# Altium footprint library B105ic.PcbLib: 84 footprints (part 5 of 6)
Each footprint in its own frame and in the unit in brackets; x right, y up, seen from the top. Pads: shape width x height; smd on the part's side, far side on the other; paste and mask are expansions set on the pad; w line width, h text height; cw(c..) or ccw(c..) is an arc to the next point about the centre after c.
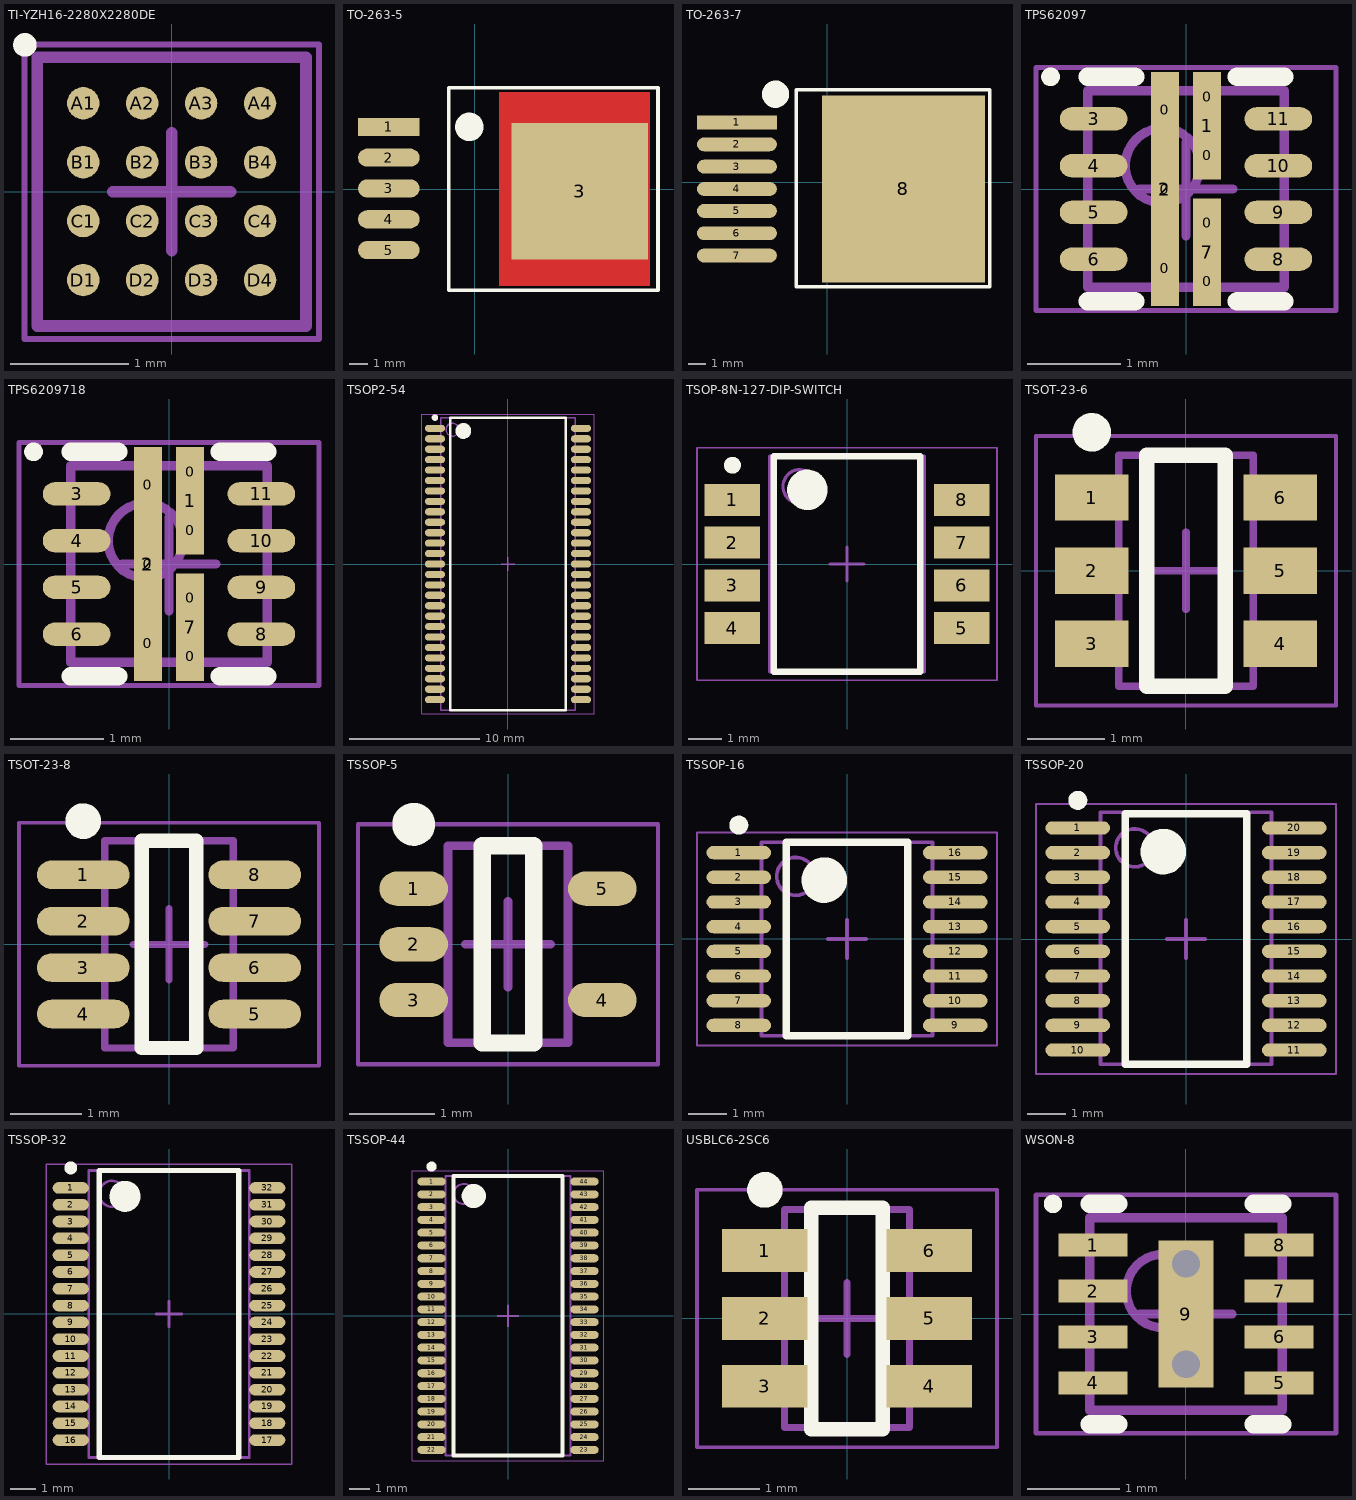
[diagram p4: the footprints below, top view; thin cyan lines are the x and y axes]

## TI-YZH16-2280X2280DE [mm] "BGA, 16-Balls, Body 2.28x2.28mm, Pitch 0.5mm"
height 0.63
pads (16):
  round 0.275 smd paste-0.138 mask+0.05: A1(-0.75,0.75) A2(-0.25,0.75) A3(0.25,0.75) A4(0.75,0.75) B1(-0.75,0.25) B2(-0.25,0.25) B3(0.25,0.25) B4(0.75,0.25) C1(-0.75,-0.25) C2(-0.25,-0.25) C3(0.25,-0.25) C4(0.75,-0.25) D1(-0.75,-0.75) D2(-0.25,-0.75) D3(0.25,-0.75) D4(0.75,-0.75)
Top Overlay:
  circle w0.1: c-1.245,1.245 r0.05
Top Paste:
  circle w0.05: c-0.162,-0.162 r0.025
  circle w0.05: c-0.338,-0.337 r0.025
  circle w0.05: c-0.338,-0.162 r0.025
  circle w0.05: c-0.162,-0.337 r0.025
  circle w0.05: c-0.162,0.162 r0.025
  circle w0.05: c-0.338,0.337 r0.025
  circle w0.05: c-0.338,0.162 r0.025
  circle w0.05: c-0.162,0.337 r0.025
  circle w0.05: c0.337,-0.337 r0.025
  circle w0.05: c0.162,-0.162 r0.025
  circle w0.05: c0.162,-0.337 r0.025
  circle w0.05: c0.337,-0.162 r0.025
  circle w0.05: c0.838,-0.337 r0.025
  circle w0.05: c0.662,-0.162 r0.025
  circle w0.05: c0.662,-0.337 r0.025
  circle w0.05: c0.838,-0.162 r0.025
  circle w0.05: c0.838,-0.838 r0.025
  circle w0.05: c0.662,-0.663 r0.025
  circle w0.05: c0.662,-0.838 r0.025
  circle w0.05: c0.838,-0.663 r0.025
  circle w0.05: c0.337,-0.838 r0.025
  circle w0.05: c0.162,-0.663 r0.025
  circle w0.05: c0.162,-0.838 r0.025
  circle w0.05: c0.337,-0.663 r0.025
  circle w0.05: c-0.162,-0.838 r0.025
  circle w0.05: c-0.338,-0.663 r0.025
  circle w0.05: c-0.338,-0.838 r0.025
  circle w0.05: c-0.162,-0.663 r0.025
  circle w0.05: c-0.663,-0.838 r0.025
  circle w0.05: c-0.838,-0.663 r0.025
  circle w0.05: c-0.838,-0.838 r0.025
  circle w0.05: c-0.663,-0.663 r0.025
  circle w0.05: c-0.663,-0.337 r0.025
  circle w0.05: c-0.838,-0.162 r0.025
  circle w0.05: c-0.838,-0.337 r0.025
  circle w0.05: c-0.663,-0.162 r0.025
  circle w0.05: c-0.663,0.162 r0.025
  circle w0.05: c-0.838,0.337 r0.025
  circle w0.05: c-0.838,0.162 r0.025
  circle w0.05: c-0.663,0.337 r0.025
  circle w0.05: c-0.663,0.663 r0.025
  circle w0.05: c-0.838,0.838 r0.025
  circle w0.05: c-0.838,0.663 r0.025
  circle w0.05: c-0.663,0.838 r0.025
  circle w0.05: c-0.162,0.663 r0.025
  circle w0.05: c-0.338,0.838 r0.025
  circle w0.05: c-0.338,0.663 r0.025
  circle w0.05: c-0.162,0.838 r0.025
  circle w0.05: c0.337,0.663 r0.025
  circle w0.05: c0.162,0.838 r0.025
  circle w0.05: c0.162,0.663 r0.025
  circle w0.05: c0.337,0.838 r0.025
  circle w0.05: c0.337,0.162 r0.025
  circle w0.05: c0.162,0.337 r0.025
  circle w0.05: c0.162,0.162 r0.025
  circle w0.05: c0.337,0.337 r0.025
  circle w0.05: c0.838,0.663 r0.025
  circle w0.05: c0.662,0.838 r0.025
  circle w0.05: c0.662,0.663 r0.025
  circle w0.05: c0.838,0.838 r0.025
  circle w0.05: c0.838,0.162 r0.025
  circle w0.05: c0.662,0.337 r0.025
  circle w0.05: c0.662,0.162 r0.025
  circle w0.05: c0.838,0.337 r0.025
  rectangle: -0.337,-0.387 -0.163,-0.337
  region: -0.388,-0.163 -0.388,-0.338 -0.338,-0.338 -0.338,-0.163
  region: -0.163,-0.112 -0.337,-0.112 -0.337,-0.162 -0.163,-0.162
  region: -0.112,-0.338 -0.112,-0.162 -0.162,-0.162 -0.162,-0.338
  region: -0.338,-0.163 -0.338,-0.337 -0.163,-0.337 -0.163,-0.163
  region: -0.338,0.337 -0.338,0.163 -0.163,0.163 -0.163,0.337
  region: -0.112,0.162 -0.112,0.337 -0.162,0.337 -0.162,0.162
  region: -0.163,0.387 -0.337,0.387 -0.337,0.337 -0.163,0.337
  region: -0.388,0.337 -0.388,0.162 -0.338,0.162 -0.338,0.337
  rectangle: -0.337,0.113 -0.163,0.163
  region: 0.162,-0.163 0.162,-0.337 0.337,-0.337 0.337,-0.163
  region: 0.387,-0.338 0.387,-0.162 0.337,-0.162 0.337,-0.338
  region: 0.337,-0.112 0.163,-0.112 0.163,-0.162 0.337,-0.162
  region: 0.112,-0.163 0.112,-0.338 0.162,-0.338 0.162,-0.163
  rectangle: 0.162,-0.387 0.337,-0.337
  region: 0.662,-0.163 0.662,-0.337 0.838,-0.337 0.838,-0.163
  region: 0.888,-0.338 0.888,-0.162 0.838,-0.162 0.838,-0.338
  region: 0.837,-0.112 0.663,-0.112 0.663,-0.162 0.837,-0.162
  region: 0.612,-0.163 0.612,-0.338 0.662,-0.338 0.662,-0.163
  rectangle: 0.663,-0.387 0.837,-0.337
  region: 0.662,-0.663 0.662,-0.837 0.838,-0.837 0.838,-0.663
  region: 0.888,-0.838 0.888,-0.663 0.838,-0.663 0.838,-0.838
  region: 0.837,-0.613 0.663,-0.613 0.663,-0.663 0.837,-0.663
  region: 0.612,-0.663 0.612,-0.838 0.662,-0.838 0.662,-0.663
  rectangle: 0.663,-0.887 0.837,-0.837
  region: 0.162,-0.663 0.162,-0.837 0.337,-0.837 0.337,-0.663
  region: 0.387,-0.838 0.387,-0.663 0.337,-0.663 0.337,-0.838
  region: 0.337,-0.613 0.163,-0.613 0.163,-0.663 0.337,-0.663
  region: 0.112,-0.663 0.112,-0.838 0.162,-0.838 0.162,-0.663
  rectangle: 0.162,-0.887 0.337,-0.837
  region: -0.338,-0.663 -0.338,-0.837 -0.163,-0.837 -0.163,-0.663
  region: -0.112,-0.838 -0.112,-0.663 -0.162,-0.663 -0.162,-0.838
  region: -0.163,-0.613 -0.337,-0.613 -0.337,-0.663 -0.163,-0.663
  region: -0.388,-0.663 -0.388,-0.838 -0.338,-0.838 -0.338,-0.663
  rectangle: -0.337,-0.887 -0.163,-0.837
  region: -0.838,-0.663 -0.838,-0.837 -0.663,-0.837 -0.663,-0.663
  region: -0.613,-0.838 -0.613,-0.663 -0.663,-0.663 -0.663,-0.838
  region: -0.663,-0.613 -0.837,-0.613 -0.837,-0.663 -0.663,-0.663
  region: -0.888,-0.663 -0.888,-0.838 -0.838,-0.838 -0.838,-0.663
  rectangle: -0.838,-0.887 -0.663,-0.837
  region: -0.838,-0.163 -0.838,-0.337 -0.663,-0.337 -0.663,-0.163
  region: -0.613,-0.338 -0.613,-0.162 -0.663,-0.162 -0.663,-0.338
  region: -0.663,-0.112 -0.837,-0.112 -0.837,-0.162 -0.663,-0.162
  region: -0.888,-0.163 -0.888,-0.338 -0.838,-0.338 -0.838,-0.163
  rectangle: -0.838,-0.387 -0.663,-0.337
  region: -0.838,0.337 -0.838,0.163 -0.663,0.163 -0.663,0.337
  region: -0.613,0.162 -0.613,0.337 -0.663,0.337 -0.663,0.162
  region: -0.663,0.387 -0.837,0.387 -0.837,0.337 -0.663,0.337
  region: -0.888,0.337 -0.888,0.162 -0.838,0.162 -0.838,0.337
  rectangle: -0.838,0.113 -0.663,0.163
  region: -0.838,0.837 -0.838,0.663 -0.663,0.663 -0.663,0.837
  region: -0.613,0.662 -0.613,0.838 -0.663,0.838 -0.663,0.662
  region: -0.663,0.888 -0.837,0.888 -0.837,0.838 -0.663,0.838
  region: -0.888,0.838 -0.888,0.662 -0.838,0.662 -0.838,0.838
  rectangle: -0.838,0.613 -0.663,0.663
  region: -0.338,0.837 -0.338,0.663 -0.163,0.663 -0.163,0.837
  region: -0.112,0.662 -0.112,0.838 -0.162,0.838 -0.162,0.662
  region: -0.163,0.888 -0.337,0.888 -0.337,0.838 -0.163,0.838
  region: -0.388,0.838 -0.388,0.662 -0.338,0.662 -0.338,0.838
  rectangle: -0.337,0.613 -0.163,0.663
  region: 0.162,0.837 0.162,0.663 0.337,0.663 0.337,0.837
  region: 0.387,0.662 0.387,0.838 0.337,0.838 0.337,0.662
  region: 0.337,0.888 0.163,0.888 0.163,0.838 0.337,0.838
  region: 0.112,0.838 0.112,0.662 0.162,0.662 0.162,0.838
  rectangle: 0.162,0.613 0.337,0.663
  region: 0.162,0.337 0.162,0.163 0.337,0.163 0.337,0.337
  region: 0.387,0.162 0.387,0.337 0.337,0.337 0.337,0.162
  region: 0.337,0.387 0.163,0.387 0.163,0.337 0.337,0.337
  region: 0.112,0.337 0.112,0.162 0.162,0.162 0.162,0.337
  rectangle: 0.162,0.113 0.337,0.163
  region: 0.662,0.837 0.662,0.663 0.838,0.663 0.838,0.837
  region: 0.888,0.662 0.888,0.838 0.838,0.838 0.838,0.662
  region: 0.837,0.888 0.663,0.888 0.663,0.838 0.837,0.838
  region: 0.612,0.838 0.612,0.662 0.662,0.662 0.662,0.838
  rectangle: 0.663,0.613 0.837,0.663
  region: 0.662,0.337 0.662,0.163 0.838,0.163 0.838,0.337
  region: 0.888,0.162 0.888,0.337 0.838,0.337 0.838,0.162
  region: 0.837,0.387 0.663,0.387 0.663,0.337 0.837,0.337
  region: 0.612,0.337 0.612,0.162 0.662,0.162 0.662,0.337
  rectangle: 0.663,0.113 0.837,0.163
Mechanical 13:
  lines w0.1: -1.14,-1.14 -1.14,1.14 1.14,1.14 1.14,-1.14 -1.14,-1.14
Mechanical 15:
  lines w0.05: -1.25,-1.25 -1.25,1.25 1.25,1.25 1.25,-1.25 -1.25,-1.25
  lines w0.1: -0.5,0 0.5,0 ; 0,-0.5 0,0.5
3D body: height 0.63, standoff 0.15, extent -1.14,-1.14 1.14,1.14

## TO-263-5 [mm]
pads (6):
  rect 3.4x1 smd: 1(-4.754,3.446)
  oval 3.4x1 smd: 2(-4.754,1.746) 3(-4.754,0.046) 4(-4.754,-1.654) 5(-4.754,-3.354)
  rect 7.524x7.524 smd: 3(5.787,-0.11)
Top Layer:
  region: 1.342,-5.317 9.66,-5.317 9.66,5.351 1.342,5.351
Top Overlay:
  circle w1: c-0.309,3.446 r0.284
  lines w0.2: -1.452,-5.571 10.105,-5.571 10.105,5.605 -1.452,5.605 -1.452,-5.571
3D body "User Library-TO-263-5.STEP": height 4.56, standoff 0, extent -5.18,-5.063 8.834,5.097

## TO-263-7 [mm]
pads (8):
  rect 4.6x0.8 smd: 1(-5.204,3.446)
  oval 4.6x0.8 smd: 2(-5.204,2.184) 3(-5.204,0.897) 4(-5.204,-0.39) 5(-5.204,-1.651) 6(-5.204,-2.938) 7(-5.204,-4.225)
  rect 9.4x10.8 smd: 8(4.387,-0.39)
Top Overlay:
  circle w1: c-2.975,5.075 r0.284
  lines w0.2: -1.775,-6.025 9.375,-6.025 9.375,5.325 -1.775,5.325 -1.775,-6.025
3D body "SW3dPS-TO263-7-1.STEP": height 4.68, standoff -0.12, extent -6.71,-5.39 8.96,4.611

## TPS62097 [mm]
height 1
pads (18):
  rect 0.2x0.648 on Top Paste: 0(-0.225,-0.85) 0(-0.225,0) 0(-0.225,0.85)
  rect 0.2x0.425 on Top Paste: 0(0.225,-0.988) 0(0.225,-0.363) 0(0.225,0.363) 0(0.225,0.988)
  rect 0.3x1.15 smd paste-0.15 mask-0.05: 1(0.225,0.675) 7(0.225,-0.675)
  rect 0.3x2.5 smd paste-0.15 mask-0.05: 2(-0.225,0)
  oval 0.725x0.25 smd mask+0.05: 3(-0.988,0.75) 4(-0.988,0.25) 5(-0.988,-0.25) 6(-0.988,-0.75) 8(0.988,-0.75) 9(0.988,-0.25) 10(0.988,0.25) 11(0.988,0.75)
Top Overlay:
  circle w0.1: c-1.45,1.2 r0.05
  lines w0.2: -1.05,-1.2 -0.545,-1.2 ; -1.05,1.2 -0.545,1.2 ; 0.545,-1.2 1.05,-1.2 ; 0.545,1.2 1.05,1.2
Mechanical 13:
  circle w0.1: c-0.25,0.25 r0.4
  lines w0.1: -1.05,-1.05 -1.05,1.05 1.05,1.05 1.05,-1.05 -1.05,-1.05
Mechanical 15:
  lines w0.05: -1.605,-1.3 -1.605,1.3 1.605,1.3 1.605,-1.3 -1.605,-1.3
  lines w0.1: -0.5,0 0.5,0 ; 0,-0.5 0,0.5
3D body "DSG (S-PWSON-N8).step": height 0.8, standoff 0, extent -1.05,-1.05 1.05,1.05

## TPS6209718 [mm]
height 1
pads (18):
  rect 0.2x0.648 on Top Paste: 0(-0.225,-0.85) 0(-0.225,0) 0(-0.225,0.85)
  rect 0.2x0.425 on Top Paste: 0(0.225,-0.988) 0(0.225,-0.363) 0(0.225,0.363) 0(0.225,0.988)
  rect 0.3x1.15 smd paste-0.15 mask-0.05: 1(0.225,0.675) 7(0.225,-0.675)
  rect 0.3x2.5 smd paste-0.15 mask-0.05: 2(-0.225,0)
  oval 0.725x0.25 smd mask+0.05: 3(-0.988,0.75) 4(-0.988,0.25) 5(-0.988,-0.25) 6(-0.988,-0.75) 8(0.988,-0.75) 9(0.988,-0.25) 10(0.988,0.25) 11(0.988,0.75)
Top Overlay:
  circle w0.1: c-1.45,1.2 r0.05
  lines w0.2: -1.05,-1.2 -0.545,-1.2 ; -1.05,1.2 -0.545,1.2 ; 0.545,-1.2 1.05,-1.2 ; 0.545,1.2 1.05,1.2
Mechanical 13:
  circle w0.1: c-0.25,0.25 r0.4
  lines w0.1: -1.05,-1.05 -1.05,1.05 1.05,1.05 1.05,-1.05 -1.05,-1.05
Mechanical 15:
  lines w0.05: -1.605,-1.3 -1.605,1.3 1.605,1.3 1.605,-1.3 -1.605,-1.3
  lines w0.1: -0.5,0 0.5,0 ; 0,-0.5 0,0.5
3D body "DSG (S-PWSON-N8).step": height 0.8, standoff 0, extent -1.05,-1.05 1.05,1.05

## TSOP2-54 [mm]
height 1.2
pads (54):
  oval 1.55x0.55 smd: 1(-5.6,10.4) 2(-5.6,9.6) 3(-5.6,8.8) 4(-5.6,8) 5(-5.6,7.2) 6(-5.6,6.4) 7(-5.6,5.6) 8(-5.6,4.8) 9(-5.6,4) 10(-5.6,3.2) 11(-5.6,2.4) 12(-5.6,1.6) 13(-5.6,0.8) 14(-5.6,0) 15(-5.6,-0.8) 16(-5.6,-1.6) 17(-5.6,-2.4) 18(-5.6,-3.2) 19(-5.6,-4) 20(-5.6,-4.8) 21(-5.6,-5.6) 22(-5.6,-6.4) 23(-5.6,-7.2) 24(-5.6,-8) 25(-5.6,-8.8) 26(-5.6,-9.6) 27(-5.6,-10.4) 28(5.6,-10.4) 29(5.6,-9.6) 30(5.6,-8.8) 31(5.6,-8) 32(5.6,-7.2) 33(5.6,-6.4) 34(5.6,-5.6) 35(5.6,-4.8) 36(5.6,-4) 37(5.6,-3.2) 38(5.6,-2.4) 39(5.6,-1.6) 40(5.6,-0.8) 41(5.6,0) 42(5.6,0.8) 43(5.6,1.6) 44(5.6,2.4) 45(5.6,3.2) 46(5.6,4) 47(5.6,4.8) 48(5.6,5.6) 49(5.6,6.4) 50(5.6,7.2) 51(5.6,8) 52(5.6,8.8) 53(5.6,9.6) 54(5.6,10.4)
Top Overlay:
  circle w0.25: c-5.6,11.225 r0.125
  circle w0.6: c-3.425,10.2 r0.3
  lines w0.2: -4.425,-11.2 -4.425,11.2 4.425,11.2 4.425,-11.2 -4.425,-11.2
Mechanical 13:
  circle w0.1: c-4.25,10.3 r0.5
  lines w0.1: -5.15,-11.2 -5.15,11.2 5.15,11.2 5.15,-11.2 -5.15,-11.2
Mechanical 15:
  lines w0.05: -6.625,-11.5 -6.625,11.5 6.625,11.5 6.625,-11.5 -6.625,-11.5
  lines w0.1: -0.5,0 0.5,0 ; 0,-0.5 0,0.5
3D body "SW3dPS-TSOP2-54.STEP": height 1.3, standoff -0.4, extent -5.88,-11.12 5.88,11.1

## TSOP-8N-127-DIP-SWITCH [mm] "TSOP, 8-Leads, Body 6.35x4.50mm, Pitch 1.27mm, IPC Medium Density"
height 1.4
pads (8):
  rect 1.65x0.95 smd: 1(-3.4,1.905) 2(-3.4,0.635) 3(-3.4,-0.635) 4(-3.4,-1.905) 5(3.4,-1.905) 6(3.4,-0.635) 7(3.4,0.635) 8(3.4,1.905)
Top Overlay:
  circle w0.25: c-3.4,2.93 r0.125
  circle w0.6: c-1.175,2.2 r0.3
  lines w0.2: -2.175,-3.2 -2.175,3.2 2.175,3.2 2.175,-3.2 -2.175,-3.2
Mechanical 13:
  circle w0.1: c-1.4,2.3 r0.5
  lines w0.1: -2.3,-3.2 -2.3,3.2 2.3,3.2 2.3,-3.2 -2.3,-3.2
Mechanical 15:
  lines w0.05: -4.45,-3.45 -4.45,3.45 4.45,3.45 4.45,-3.45 -4.45,-3.45
  lines w0.1: -0.5,0 0.5,0 ; 0,-0.5 0,0.5
3D body "TSOP_DIP_SWITCH.STEP": height 1.5, standoff 0, extent -3.488,-3.135 3.488,3.175

## TSOT-23-6 [mm] "SOT23, 6-Leads, Body 2,95x2,80mm, Pitch 0,95mm, IPC Medium Density"
height 0.9
pads (6):
  rect 0.95x0.6 smd: 1(-1.225,0.95) 2(-1.225,0) 3(-1.225,-0.95) 4(1.225,-0.95) 5(1.225,0) 6(1.225,0.95)
Top Overlay:
  circle w0.25: c-1.225,1.8 r0.125
  lines w0.2: -0.508,-1.5 0.508,-1.5 0.508,1.5 -0.508,1.5 -0.508,-1.5
Mechanical 13:
  lines w0.1: -0.875,-1.5 -0.875,1.5 0.875,1.5 0.875,-1.5 -0.875,-1.5
Mechanical 15:
  lines w0.05: -1.95,-1.75 -1.95,1.75 1.95,1.75 1.95,-1.75 -1.95,-1.75
  lines w0.1: -0.5,0 0.5,0 ; 0,-0.5 0,0.5
3D body "User Library-TSOT-23-6.step": height 0.86, standoff 0, extent -1.405,-1.5 1.405,1.5

## TSOT-23-8 [mm] "TSOP, 8-Leads, Body 2,90x1,63mm, Pitch 0,65mm, IPC Medium Density"
height 0.9
pads (8):
  oval 1.3x0.4 smd: 1(-1.2,0.975) 2(-1.2,0.325) 3(-1.2,-0.325) 4(-1.2,-0.975) 5(1.2,-0.975) 6(1.2,-0.325) 7(1.2,0.325) 8(1.2,0.975)
Top Overlay:
  circle w0.25: c-1.2,1.725 r0.125
  lines w0.2: -0.381,-1.45 0.381,-1.45 0.381,1.45 -0.381,1.45 -0.381,-1.45
Mechanical 13:
  lines w0.1: -0.9,-1.45 0.9,-1.45 0.9,1.45 -0.9,1.45 -0.9,-1.45
Mechanical 15:
  lines w0.05: -2.1,-1.7 2.1,-1.7 2.1,1.7 -2.1,1.7 -2.1,-1.7
  lines w0.1: -0.5,0 0.5,0 ; 0,-0.5 0,0.5
3D body "User Library-TSOT-23-8.STEP": height 1, standoff 0, extent -1.4,-1.45 1.4,1.45

## TSSOP-5 [mm] "TSSOP, 5-Leads, Body 2,05x1,25mm, Pitch 0,65mm, IPC Medium Density"
height 1.1
pads (5):
  oval 0.8x0.4 smd: 1(-1.1,0.65) 2(-1.1,0) 3(-1.1,-0.65) 4(1.1,-0.65) 5(1.1,0.65)
Top Overlay:
  circle w0.25: c-1.1,1.4 r0.125
  lines w0.2: -0.3,-1.15 0.3,-1.15 0.3,1.15 -0.3,1.15 -0.3,-1.15
Mechanical 13:
  lines w0.1: -0.7,-1.15 0.7,-1.15 0.7,1.15 -0.7,1.15 -0.7,-1.15
Mechanical 15:
  lines w0.05: -1.75,-1.4 1.75,-1.4 1.75,1.4 -1.75,1.4 -1.75,-1.4
  lines w0.1: -0.5,0 0.5,0 ; 0,-0.5 0,0.5
3D body "TSSOP-5.STEP": height 1.1, standoff -0.01, extent -1.125,-1.125 1.125,1.125

## TSSOP-16 [mm] "TSOP, 16-Leads, Body 5,00x4,40mm, Pitch 0,65mm, IPC Medium Density"
height 0.9
pads (16):
  oval 1.7x0.35 smd: 1(-2.85,2.275) 2(-2.85,1.625) 3(-2.85,0.975) 4(-2.85,0.325) 5(-2.85,-0.325) 6(-2.85,-0.975) 7(-2.85,-1.625) 8(-2.85,-2.275) 9(2.85,-2.275) 10(2.85,-1.625) 11(2.85,-0.975) 12(2.85,-0.325) 13(2.85,0.325) 14(2.85,0.975) 15(2.85,1.625) 16(2.85,2.275)
Top Overlay:
  circle w0.6: c-0.6,1.55 r0.3
  circle w0.25: c-2.85,3 r0.125
  lines w0.2: -1.6,-2.55 1.6,-2.55 1.6,2.55 -1.6,2.55 -1.6,-2.55
Mechanical 13:
  circle w0.1: c-1.35,1.65 r0.5
  lines w0.1: -2.25,-2.55 2.25,-2.55 2.25,2.55 -2.25,2.55 -2.25,-2.55
Mechanical 15:
  lines w0.05: -3.95,-2.8 3.95,-2.8 3.95,2.8 -3.95,2.8 -3.95,-2.8
  lines w0.1: -0.5,0 0.5,0 ; 0,-0.5 0,0.5
3D body "TSSOP-16-1.step": height 1.1, standoff 0, extent -3.2,-2.5 3.2,2.5

## TSSOP-20 [mm] "TSOP, 20-Leads, Body 6,50x4,40mm, Pitch 0,65mm, IPC Medium Density"
height 0.9
pads (20):
  oval 1.7x0.35 smd: 1(-2.85,2.925) 2(-2.85,2.275) 3(-2.85,1.625) 4(-2.85,0.975) 5(-2.85,0.325) 6(-2.85,-0.325) 7(-2.85,-0.975) 8(-2.85,-1.625) 9(-2.85,-2.275) 10(-2.85,-2.925) 11(2.85,-2.925) 12(2.85,-2.275) 13(2.85,-1.625) 14(2.85,-0.975) 15(2.85,-0.325) 16(2.85,0.325) 17(2.85,0.975) 18(2.85,1.625) 19(2.85,2.275) 20(2.85,2.925)
Top Overlay:
  circle w0.6: c-0.6,2.3 r0.3
  circle w0.25: c-2.85,3.65 r0.125
  lines w0.2: -1.6,-3.3 1.6,-3.3 1.6,3.3 -1.6,3.3 -1.6,-3.3
Mechanical 13:
  circle w0.1: c-1.35,2.4 r0.5
  lines w0.1: -2.25,-3.3 2.25,-3.3 2.25,3.34 -2.25,3.34 -2.25,-3.3
Mechanical 15:
  lines w0.05: -3.95,-3.55 3.95,-3.55 3.95,3.55 -3.95,3.55 -3.95,-3.55
  lines w0.1: -0.5,0 0.5,0 ; 0,-0.5 0,0.5
3D body "TSSOP20.step": height 1.09, standoff 0, extent -3.14,-3.355 3.14,3.145

## TSSOP-32 [mm] "TSOP, 32-Leads, Body 11,00x6,10mm, Pitch 0,65mm, IPC Medium Density"
height 1.2
pads (32):
  oval 1.4x0.45 smd: 1(-3.8,4.875) 2(-3.8,4.225) 3(-3.8,3.575) 4(-3.8,2.925) 5(-3.8,2.275) 6(-3.8,1.625) 7(-3.8,0.975) 8(-3.8,0.325) 9(-3.8,-0.325) 10(-3.8,-0.975) 11(-3.8,-1.625) 12(-3.8,-2.275) 13(-3.8,-2.925) 14(-3.8,-3.575) 15(-3.8,-4.225) 16(-3.8,-4.875) 17(3.8,-4.875) 18(3.8,-4.225) 19(3.8,-3.575) 20(3.8,-2.925) 21(3.8,-2.275) 22(3.8,-1.625) 23(3.8,-0.975) 24(3.8,-0.325) 25(3.8,0.325) 26(3.8,0.975) 27(3.8,1.625) 28(3.8,2.275) 29(3.8,2.925) 30(3.8,3.575) 31(3.8,4.225) 32(3.8,4.875)
Top Overlay:
  circle w0.6: c-1.7,4.55 r0.3
  circle w0.25: c-3.8,5.65 r0.125
  lines w0.2: -2.7,-5.55 2.7,-5.55 2.7,5.55 -2.7,5.55 -2.7,-5.55
Mechanical 13:
  circle w0.1: c-2.2,4.65 r0.5
  lines w0.1: -3.1,-5.55 3.1,-5.55 3.1,5.55 -3.1,5.55 -3.1,-5.55
Mechanical 15:
  lines w0.05: -4.75,-5.8 4.75,-5.8 4.75,5.8 -4.75,5.8 -4.75,-5.8
  lines w0.1: -0.5,0 0.5,0 ; 0,-0.5 0,0.5
3D body "User Library-TSSOP-32 11_1x6_2.STEP": height 1.05, standoff -0.05, extent -4.05,-5.55 4.05,5.55

## TSSOP-44 [mm] "TSSOP, 44-Leads, Body 14,00x6,10mm, Pitch 0,64mm, IPC Medium Density"
height 1.2
pads (44):
  oval 1.4x0.4 smd: 1(-3.8,6.667) 2(-3.8,6.032) 3(-3.8,5.397) 4(-3.8,4.763) 5(-3.8,4.127) 6(-3.8,3.492) 7(-3.8,2.857) 8(-3.8,2.222) 9(-3.8,1.587) 10(-3.8,0.953) 11(-3.8,0.318) 12(-3.8,-0.318) 13(-3.8,-0.953) 14(-3.8,-1.587) 15(-3.8,-2.222) 16(-3.8,-2.857) 17(-3.8,-3.492) 18(-3.8,-4.127) 19(-3.8,-4.763) 20(-3.8,-5.397) 21(-3.8,-6.032) 22(-3.8,-6.667) 23(3.8,-6.667) 24(3.8,-6.032) 25(3.8,-5.397) 26(3.8,-4.763) 27(3.8,-4.127) 28(3.8,-3.492) 29(3.8,-2.857) 30(3.8,-2.222) 31(3.8,-1.587) 32(3.8,-0.953) 33(3.8,-0.318) 34(3.8,0.318) 35(3.8,0.953) 36(3.8,1.587) 37(3.8,2.222) 38(3.8,2.857) 39(3.8,3.492) 40(3.8,4.127) 41(3.8,4.763) 42(3.8,5.397) 43(3.8,6.032) 44(3.8,6.667)
Top Overlay:
  circle w0.25: c-3.8,7.418 r0.125
  circle w0.6: c-1.7,5.95 r0.3
  lines w0.2: -2.7,-6.95 -2.7,6.95 2.7,6.95 2.7,-6.95 -2.7,-6.95
Mechanical 13:
  circle w0.1: c-2.2,6.05 r0.5
  lines w0.1: -3.1,-6.95 -3.1,6.95 3.1,6.95 3.1,-6.95 -3.1,-6.95
Mechanical 15:
  lines w0.05: -4.75,-7.2 -4.75,7.2 4.75,7.2 4.75,-7.2 -4.75,-7.2
  lines w0.1: -0.5,0 0.5,0 ; 0,-0.5 0,0.5
3D body "User Library-DDV0044D.step": height 1, standoff -0.03, extent -4.035,-7 4.075,7

## USBLC6-2SC6 [mm] "SOT23, 6-Leads, Body 2,92x2,80mm, Pitch 0,95mm, IPC Medium Density"
height 1.45
pads (6):
  rect 1.2x0.6 smd: 1(-1.15,0.95) 2(-1.15,0) 3(-1.15,-0.95) 4(1.15,-0.95) 5(1.15,0) 6(1.15,0.95)
Top Overlay:
  circle w0.25: c-1.15,1.8 r0.125
  lines w0.2: -0.5,-1.55 -0.5,1.55 0.5,1.55 0.5,-1.55 -0.5,-1.55
Mechanical 13:
  lines w0.1: -0.875,-1.525 0.875,-1.525 0.875,1.525 -0.875,1.525 -0.875,-1.525
Mechanical 15:
  lines w0.05: -2.1,-1.8 2.1,-1.8 2.1,1.8 -2.1,1.8 -2.1,-1.8
  lines w0.1: -0.5,0 0.5,0 ; 0,-0.5 0,0.5
3D body "USBLC6-2SC6.step": height 1.45, standoff 0, extent -1.4,-1.45 1.4,1.45

## WSON-8 [mm] "SON, 8-Leads, Body 2,10x2,10mm, Pitch 0,50mm, Thermal Pad 1,60x0,88mm, IPC Medium Density"
height 0.8
pads (9):
  rect 0.75x0.25 smd: 1(-1.015,0.75) 2(-1.015,0.25) 3(-1.015,-0.25) 4(-1.015,-0.75) 5(1.015,-0.75) 6(1.015,-0.25) 7(1.015,0.25) 8(1.015,0.75)
  rect 0.6x1.6 smd: 9(0,0)
via 0,-0.55 diameter 0.4 hole 0.3
via 0,0.55 diameter 0.4 hole 0.3
Top Overlay:
  circle w0.1: c-1.45,1.2 r0.05
  lines w0.2: -1.05,-1.2 -0.74,-1.2 ; -1.05,1.2 -0.74,1.2 ; 0.74,-1.2 1.05,-1.2 ; 0.74,1.2 1.05,1.2
Mechanical 13:
  circle w0.1: c-0.25,0.25 r0.4
  lines w0.1: -1.05,-1.05 1.05,-1.05 1.05,1.05 -1.05,1.05 -1.05,-1.05
Mechanical 15:
  lines w0.05: -1.635,-1.3 1.635,-1.3 1.635,1.3 -1.635,1.3 -1.635,-1.3
  lines w0.1: -0.5,0 0.5,0 ; 0,-0.5 0,0.5
3D body "User Library-SON8-2x2mm-1.step": height 0.77, standoff -0.03, extent -1,-1 1,1